# Altium schematic symbol library Regulator_Switching.SchLib: 1120 symbols (part 5 of 8) (continued)
## PAM2305AAB120 (continued)
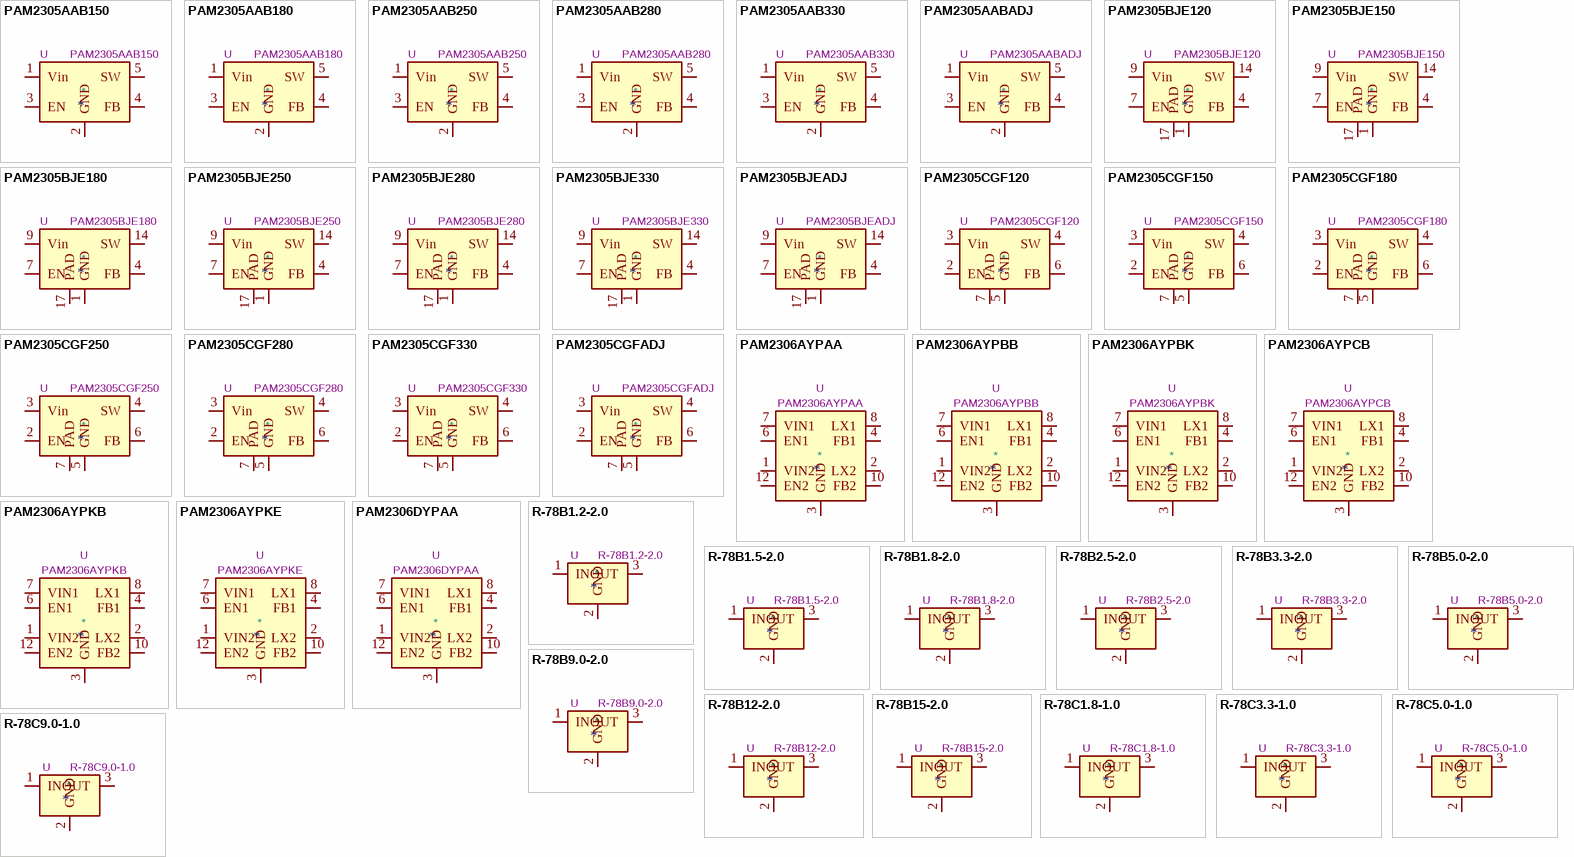
[diagram p17: symbols PAM2305AAB150 to R-78C9.0-1.0]

## PAM2305AAB150
designator *  value PAM2305AAB150  Reference: U
ki_keywords: Voltage regulator switching buck fixed output analog; ki_description: 1A, Step-Down DC/DC-Converter, 1.5V Fixed Output Voltage, 1.5MHz, TSOT-23; ki_fp_filters: TSOT?23*; Footprint: Package_TO_SOT_SMD:TSOT-23-5; Datasheet: https://www.diodes.com/assets/Datasheets/PAM2305.pdf
pins: 1 Vin, 2 GND, 3 EN, 4 FB, 5 SW

## PAM2305AAB180
designator *  value PAM2305AAB180  Reference: U
ki_keywords: Voltage regulator switching buck fixed output analog; ki_description: 1A, Step-Down DC/DC-Converter, 1.8V Fixed Output Voltage, 1.5MHz, TSOT-23; ki_fp_filters: TSOT?23*; Footprint: Package_TO_SOT_SMD:TSOT-23-5; Datasheet: https://www.diodes.com/assets/Datasheets/PAM2305.pdf
pins: 1 Vin, 2 GND, 3 EN, 4 FB, 5 SW

## PAM2305AAB250
designator *  value PAM2305AAB250  Reference: U
ki_keywords: Voltage regulator switching buck fixed output analog; ki_description: 1A, Step-Down DC/DC-Converter, 2.5V Fixed Output Voltage, 1.5MHz, TSOT-23; ki_fp_filters: TSOT?23*; Footprint: Package_TO_SOT_SMD:TSOT-23-5; Datasheet: https://www.diodes.com/assets/Datasheets/PAM2305.pdf
pins: 1 Vin, 2 GND, 3 EN, 4 FB, 5 SW

## PAM2305AAB280
designator *  value PAM2305AAB280  Reference: U
ki_keywords: Voltage regulator switching buck fixed output analog; ki_description: 1A, Step-Down DC/DC-Converter, 2.8V Fixed Output Voltage, 1.5MHz, TSOT-23; ki_fp_filters: TSOT?23*; Footprint: Package_TO_SOT_SMD:TSOT-23-5; Datasheet: https://www.diodes.com/assets/Datasheets/PAM2305.pdf
pins: 1 Vin, 2 GND, 3 EN, 4 FB, 5 SW

## PAM2305AAB330
designator *  value PAM2305AAB330  Reference: U
ki_keywords: Voltage regulator switching buck fixed output analog; ki_description: 1A, Step-Down DC/DC-Converter, 3.3V Fixed Output Voltage, 1.5MHz, TSOT-23; ki_fp_filters: TSOT?23*; Footprint: Package_TO_SOT_SMD:TSOT-23-5; Datasheet: https://www.diodes.com/assets/Datasheets/PAM2305.pdf
pins: 1 Vin, 2 GND, 3 EN, 4 FB, 5 SW

## PAM2305AABADJ
designator *  value PAM2305AABADJ  Reference: U
ki_keywords: Voltage regulator switching buck fixed output analog; ki_description: 1A, Step-Down DC/DC-Converter, Adjustable Output Voltage, 1.5MHz, TSOT-23; ki_fp_filters: TSOT?23*; Footprint: Package_TO_SOT_SMD:TSOT-23-5; Datasheet: https://www.diodes.com/assets/Datasheets/PAM2305.pdf
pins: 1 Vin, 2 GND, 3 EN, 4 FB, 5 SW

## PAM2305BJE120
designator *  value PAM2305BJE120  Reference: U
ki_keywords: Voltage regulator switching buck fixed output analog; ki_description: 1A, Step-Down DC/DC-Converter, 1.2V Fixed Output Voltage, 1.5MHz, QFN-16; ki_fp_filters: QFN*EP*3x3mm*P0.5mm*; Footprint: Package_DFN_QFN:QFN-16-1EP_3x3mm_P0.5mm_EP1.7x1.7mm; Datasheet: https://www.diodes.com/assets/Datasheets/PAM2305.pdf
pins: 1 GND, 2 GND hidden, 3 GND hidden, 4 FB, 5 GND hidden, 6 NC hidden, 7 EN, 8 NC hidden, 9 Vin, 10 Vin hidden, 11 Vin hidden, 12 Vin hidden, 13 SW hidden, 14 SW, 15 SW hidden, 16 NC hidden, 17 PAD

## PAM2305BJE150
designator *  value PAM2305BJE150  Reference: U
ki_keywords: Voltage regulator switching buck fixed output analog; ki_description: 1A, Step-Down DC/DC-Converter, 1.5V Fixed Output Voltage, 1.5MHz, QFN-16; ki_fp_filters: QFN*EP*3x3mm*P0.5mm*; Footprint: Package_DFN_QFN:QFN-16-1EP_3x3mm_P0.5mm_EP1.7x1.7mm; Datasheet: https://www.diodes.com/assets/Datasheets/PAM2305.pdf
pins: 1 GND, 2 GND hidden, 3 GND hidden, 4 FB, 5 GND hidden, 6 NC hidden, 7 EN, 8 NC hidden, 9 Vin, 10 Vin hidden, 11 Vin hidden, 12 Vin hidden, 13 SW hidden, 14 SW, 15 SW hidden, 16 NC hidden, 17 PAD

## PAM2305BJE180
designator *  value PAM2305BJE180  Reference: U
ki_keywords: Voltage regulator switching buck fixed output analog; ki_description: 1A, Step-Down DC/DC-Converter, 1.8V Fixed Output Voltage, 1.5MHz, QFN-16; ki_fp_filters: QFN*EP*3x3mm*P0.5mm*; Footprint: Package_DFN_QFN:QFN-16-1EP_3x3mm_P0.5mm_EP1.7x1.7mm; Datasheet: https://www.diodes.com/assets/Datasheets/PAM2305.pdf
pins: 1 GND, 2 GND hidden, 3 GND hidden, 4 FB, 5 GND hidden, 6 NC hidden, 7 EN, 8 NC hidden, 9 Vin, 10 Vin hidden, 11 Vin hidden, 12 Vin hidden, 13 SW hidden, 14 SW, 15 SW hidden, 16 NC hidden, 17 PAD

## PAM2305BJE250
designator *  value PAM2305BJE250  Reference: U
ki_keywords: Voltage regulator switching buck fixed output analog; ki_description: 1A, Step-Down DC/DC-Converter, 2.5V Fixed Output Voltage, 1.5MHz, QFN-16; ki_fp_filters: QFN*EP*3x3mm*P0.5mm*; Footprint: Package_DFN_QFN:QFN-16-1EP_3x3mm_P0.5mm_EP1.7x1.7mm; Datasheet: https://www.diodes.com/assets/Datasheets/PAM2305.pdf
pins: 1 GND, 2 GND hidden, 3 GND hidden, 4 FB, 5 GND hidden, 6 NC hidden, 7 EN, 8 NC hidden, 9 Vin, 10 Vin hidden, 11 Vin hidden, 12 Vin hidden, 13 SW hidden, 14 SW, 15 SW hidden, 16 NC hidden, 17 PAD

## PAM2305BJE280
designator *  value PAM2305BJE280  Reference: U
ki_keywords: Voltage regulator switching buck fixed output analog; ki_description: 1A, Step-Down DC/DC-Converter, 2.8V Fixed Output Voltage, 1.5MHz, QFN-16; ki_fp_filters: QFN*EP*3x3mm*P0.5mm*; Footprint: Package_DFN_QFN:QFN-16-1EP_3x3mm_P0.5mm_EP1.7x1.7mm; Datasheet: https://www.diodes.com/assets/Datasheets/PAM2305.pdf
pins: 1 GND, 2 GND hidden, 3 GND hidden, 4 FB, 5 GND hidden, 6 NC hidden, 7 EN, 8 NC hidden, 9 Vin, 10 Vin hidden, 11 Vin hidden, 12 Vin hidden, 13 SW hidden, 14 SW, 15 SW hidden, 16 NC hidden, 17 PAD

## PAM2305BJE330
designator *  value PAM2305BJE330  Reference: U
ki_keywords: Voltage regulator switching buck fixed output analog; ki_description: 1A, Step-Down DC/DC-Converter, 3.3V Fixed Output Voltage, 1.5MHz, QFN-16; ki_fp_filters: QFN*EP*3x3mm*P0.5mm*; Footprint: Package_DFN_QFN:QFN-16-1EP_3x3mm_P0.5mm_EP1.7x1.7mm; Datasheet: https://www.diodes.com/assets/Datasheets/PAM2305.pdf
pins: 1 GND, 2 GND hidden, 3 GND hidden, 4 FB, 5 GND hidden, 6 NC hidden, 7 EN, 8 NC hidden, 9 Vin, 10 Vin hidden, 11 Vin hidden, 12 Vin hidden, 13 SW hidden, 14 SW, 15 SW hidden, 16 NC hidden, 17 PAD

## PAM2305BJEADJ
designator *  value PAM2305BJEADJ  Reference: U
ki_keywords: Voltage regulator switching buck fixed output analog; ki_description: 1A, Step-Down DC/DC-Converter, Adjustable Output Voltage, 1.5MHz, QFN-16; ki_fp_filters: QFN*EP*3x3mm*P0.5mm*; Footprint: Package_DFN_QFN:QFN-16-1EP_3x3mm_P0.5mm_EP1.7x1.7mm; Datasheet: https://www.diodes.com/assets/Datasheets/PAM2305.pdf
pins: 1 GND, 2 GND hidden, 3 GND hidden, 4 FB, 5 GND hidden, 6 NC hidden, 7 EN, 8 NC hidden, 9 Vin, 10 Vin hidden, 11 Vin hidden, 12 Vin hidden, 13 SW hidden, 14 SW, 15 SW hidden, 16 NC hidden, 17 PAD

## PAM2305CGF120
designator *  value PAM2305CGF120  Reference: U
ki_keywords: Voltage regulator switching buck fixed output analog; ki_description: 1A, Step-Down DC/DC-Converter, 1.2V Fixed Output Voltage, 1.5MHz, DFN-6; ki_fp_filters: DFN*EP*2x2mm*P0.65mm*; Footprint: Package_DFN_QFN:DFN-6-1EP_2x2mm_P0.65mm_EP1x1.6mm; Datasheet: https://www.diodes.com/assets/Datasheets/PAM2305.pdf
pins: 1 NC hidden, 2 EN, 3 Vin, 4 SW, 5 GND, 6 FB, 7 PAD

## PAM2305CGF150
designator *  value PAM2305CGF150  Reference: U
ki_keywords: Voltage regulator switching buck fixed output analog; ki_description: 1A, Step-Down DC/DC-Converter, 1.5V Fixed Output Voltage, 1.5MHz, DFN-6; ki_fp_filters: DFN*EP*2x2mm*P0.65mm*; Footprint: Package_DFN_QFN:DFN-6-1EP_2x2mm_P0.65mm_EP1x1.6mm; Datasheet: https://www.diodes.com/assets/Datasheets/PAM2305.pdf
pins: 1 NC hidden, 2 EN, 3 Vin, 4 SW, 5 GND, 6 FB, 7 PAD

## PAM2305CGF180
designator *  value PAM2305CGF180  Reference: U
ki_keywords: Voltage regulator switching buck fixed output analog; ki_description: 1A, Step-Down DC/DC-Converter, 1.8V Fixed Output Voltage, 1.5MHz, DFN-6; ki_fp_filters: DFN*EP*2x2mm*P0.65mm*; Footprint: Package_DFN_QFN:DFN-6-1EP_2x2mm_P0.65mm_EP1x1.6mm; Datasheet: https://www.diodes.com/assets/Datasheets/PAM2305.pdf
pins: 1 NC hidden, 2 EN, 3 Vin, 4 SW, 5 GND, 6 FB, 7 PAD

## PAM2305CGF250
designator *  value PAM2305CGF250  Reference: U
ki_keywords: Voltage regulator switching buck fixed output analog; ki_description: 1A, Step-Down DC/DC-Converter, 2.5V Fixed Output Voltage, 1.5MHz, DFN-6; ki_fp_filters: DFN*EP*2x2mm*P0.65mm*; Footprint: Package_DFN_QFN:DFN-6-1EP_2x2mm_P0.65mm_EP1x1.6mm; Datasheet: https://www.diodes.com/assets/Datasheets/PAM2305.pdf
pins: 1 NC hidden, 2 EN, 3 Vin, 4 SW, 5 GND, 6 FB, 7 PAD

## PAM2305CGF280
designator *  value PAM2305CGF280  Reference: U
ki_keywords: Voltage regulator switching buck fixed output analog; ki_description: 1A, Step-Down DC/DC-Converter, 2.8V Fixed Output Voltage, 1.5MHz, DFN-6; ki_fp_filters: DFN*EP*2x2mm*P0.65mm*; Footprint: Package_DFN_QFN:DFN-6-1EP_2x2mm_P0.65mm_EP1x1.6mm; Datasheet: https://www.diodes.com/assets/Datasheets/PAM2305.pdf
pins: 1 NC hidden, 2 EN, 3 Vin, 4 SW, 5 GND, 6 FB, 7 PAD

## PAM2305CGF330
designator *  value PAM2305CGF330  Reference: U
ki_keywords: Voltage regulator switching buck fixed output analog; ki_description: 1A, Step-Down DC/DC-Converter, 3.3V Fixed Output Voltage, 1.5MHz, DFN-6; ki_fp_filters: DFN*EP*2x2mm*P0.65mm*; Footprint: Package_DFN_QFN:DFN-6-1EP_2x2mm_P0.65mm_EP1x1.6mm; Datasheet: https://www.diodes.com/assets/Datasheets/PAM2305.pdf
pins: 1 NC hidden, 2 EN, 3 Vin, 4 SW, 5 GND, 6 FB, 7 PAD

## PAM2305CGFADJ
designator *  value PAM2305CGFADJ  Reference: U
ki_keywords: Voltage regulator switching buck fixed output analog; ki_description: 1A, Step-Down DC/DC-Converter, Adjustable Output Voltage, 1.5MHz, DFN-6; ki_fp_filters: DFN*EP*2x2mm*P0.65mm*; Footprint: Package_DFN_QFN:DFN-6-1EP_2x2mm_P0.65mm_EP1x1.6mm; Datasheet: https://www.diodes.com/assets/Datasheets/PAM2305.pdf
pins: 1 NC hidden, 2 EN, 3 Vin, 4 SW, 5 GND, 6 FB, 7 PAD

## PAM2306AYPAA
designator *  value PAM2306AYPAA  Reference: U
ki_keywords: STEP-DOWN Dual channel 1A Out1 ADJ, Out2 ADJ; ki_description: 1A, Dual Step-Down DC/DC-Converter, Out1 ADJ, Out2 ADJ, 1.5MHz, W-DFN3x3; ki_fp_filters: WDFN*3x3mm?P0.45mm*; Footprint: Package_DFN_QFN:WDFN-12-1EP_3x3mm_P0.45mm_EP1.7x2.5mm; Datasheet: https://www.diodes.com/assets/Datasheets/PAM2306.pdf
pins: 1 VIN2, 2 LX2, 3 GND, 4 FB1, 5 NC1 hidden, 6 EN1, 7 VIN1, 8 LX1, 9 GND hidden, 10 FB2, 11 NC2 hidden, 12 EN2, 13 GND hidden

## PAM2306AYPBB
designator *  value PAM2306AYPBB  Reference: U
ki_keywords: STEP-DOWN Dual channel 1A Out1 1.2V, Out2 1.2V; ki_description: 1A, Dual Step-Down DC/DC-Converter, Out1 1.2V, Out2 1.2V, 1.5MHz, W-DFN3x3; ki_fp_filters: WDFN*3x3mm?P0.45mm*; Footprint: Package_DFN_QFN:WDFN-12-1EP_3x3mm_P0.45mm_EP1.7x2.5mm; Datasheet: https://www.diodes.com/assets/Datasheets/PAM2306.pdf
pins: 1 VIN2, 2 LX2, 3 GND, 4 FB1, 5 NC1 hidden, 6 EN1, 7 VIN1, 8 LX1, 9 GND hidden, 10 FB2, 11 NC2 hidden, 12 EN2, 13 GND hidden

## PAM2306AYPBK
designator *  value PAM2306AYPBK  Reference: U
ki_keywords: STEP-DOWN Dual channel 1A Out1 1.5V, Out2 3.3V; ki_description: 1A, Dual Step-Down DC/DC-Converter, Out1 1.2V, Out2 3.3V, 1.5MHz, W-DFN3x3; ki_fp_filters: WDFN*3x3mm?P0.45mm*; Footprint: Package_DFN_QFN:WDFN-12-1EP_3x3mm_P0.45mm_EP1.7x2.5mm; Datasheet: https://www.diodes.com/assets/Datasheets/PAM2306.pdf
pins: 1 VIN2, 2 LX2, 3 GND, 4 FB1, 5 NC1 hidden, 6 EN1, 7 VIN1, 8 LX1, 9 GND hidden, 10 FB2, 11 NC2 hidden, 12 EN2, 13 GND hidden

## PAM2306AYPCB
designator *  value PAM2306AYPCB  Reference: U
ki_keywords: STEP-DOWN Dual channel 1A Out1 1.5V, Out2 1.2V; ki_description: 1A, Dual Step-Down DC/DC-Converter, Out1 1.5V, Out2 1.2V, 1.5MHz, W-DFN3x3; ki_fp_filters: WDFN*3x3mm?P0.45mm*; Footprint: Package_DFN_QFN:WDFN-12-1EP_3x3mm_P0.45mm_EP1.7x2.5mm; Datasheet: https://www.diodes.com/assets/Datasheets/PAM2306.pdf
pins: 1 VIN2, 2 LX2, 3 GND, 4 FB1, 5 NC1 hidden, 6 EN1, 7 VIN1, 8 LX1, 9 GND hidden, 10 FB2, 11 NC2 hidden, 12 EN2, 13 GND hidden

## PAM2306AYPKB
designator *  value PAM2306AYPKB  Reference: U
ki_keywords: STEP-DOWN Dual channel 1A Out1 3.3V, Out2 1.2V; ki_description: 1A, Dual Step-Down DC/DC-Converter, Out1 3.3V, Out2 1.2V, 1.5MHz, W-DFN3x3; ki_fp_filters: WDFN*3x3mm?P0.45mm*; Footprint: Package_DFN_QFN:WDFN-12-1EP_3x3mm_P0.45mm_EP1.7x2.5mm; Datasheet: https://www.diodes.com/assets/Datasheets/PAM2306.pdf
pins: 1 VIN2, 2 LX2, 3 GND, 4 FB1, 5 NC1 hidden, 6 EN1, 7 VIN1, 8 LX1, 9 GND hidden, 10 FB2, 11 NC2 hidden, 12 EN2, 13 GND hidden

## PAM2306AYPKE
designator *  value PAM2306AYPKE  Reference: U
ki_keywords: STEP-DOWN Dual channel 1A Out1 3.3V, Out2 1.8V; ki_description: 1A, Dual Step-Down DC/DC-Converter, Out1 3.3V, Out2 1.8V, 1.5MHz, W-DFN3x3; ki_fp_filters: WDFN*3x3mm?P0.45mm*; Footprint: Package_DFN_QFN:WDFN-12-1EP_3x3mm_P0.45mm_EP1.7x2.5mm; Datasheet: https://www.diodes.com/assets/Datasheets/PAM2306.pdf
pins: 1 VIN2, 2 LX2, 3 GND, 4 FB1, 5 NC1 hidden, 6 EN1, 7 VIN1, 8 LX1, 9 GND hidden, 10 FB2, 11 NC2 hidden, 12 EN2, 13 GND hidden

## PAM2306DYPAA
designator *  value PAM2306DYPAA  Reference: U
ki_keywords: STEP-DOWN Dual channel 1A Out1 ADJ, Out2 ADJ; ki_description: 1A, Dual Step-Down DC/DC-Converter, Out1 ADJ, Out2 ADJ, 1.5MHz, W-DFN3x3; ki_fp_filters: WDFN*3x3mm?P0.45mm*; Footprint: Package_DFN_QFN:WDFN-12-1EP_3x3mm_P0.45mm_EP1.7x2.5mm; Datasheet: https://www.diodes.com/assets/Datasheets/PAM2306D.pdf
pins: 1 VIN2, 2 LX2, 3 GND, 4 FB1, 5 NC1 hidden, 6 EN1, 7 VIN1, 8 LX1, 9 GND hidden, 10 FB2, 11 NC2 hidden, 12 EN2, 13 GND hidden

## R-78B1.2-2.0
designator *  value R-78B1.2-2.0  Reference: U
ki_keywords: dc-dc recom Step-Down DC/DC-Regulator; ki_description: 2A Step-Down DC/DC-Regulator, 4.75-32V input, 1.2V fixed Output Voltage, LM78xx replacement, -40°C to +85°C, SIP3; ki_fp_filters: Converter*DCDC*RECOM*R*78B*2.0*; Footprint: Converter_DCDC:Converter_DCDC_RECOM_R-78B-2.0_THT; Datasheet: https://www.recom-power.com/pdf/Innoline/R-78Bxx-2.0.pdf
pins: 1 IN, 2 GND, 3 OUT

## R-78B1.5-2.0
designator *  value R-78B1.5-2.0  Reference: U
ki_keywords: dc-dc recom Step-Down DC/DC-Regulator; ki_description: 2A Step-Down DC/DC-Regulator, 4.75-32V input, 1.5V fixed Output Voltage, LM78xx replacement, -40°C to +85°C, SIP3; ki_fp_filters: Converter*DCDC*RECOM*R*78B*2.0*; Footprint: Converter_DCDC:Converter_DCDC_RECOM_R-78B-2.0_THT; Datasheet: https://www.recom-power.com/pdf/Innoline/R-78Bxx-2.0.pdf
pins: 1 IN, 2 GND, 3 OUT

## R-78B1.8-2.0
designator *  value R-78B1.8-2.0  Reference: U
ki_keywords: dc-dc recom Step-Down DC/DC-Regulator; ki_description: 2A Step-Down DC/DC-Regulator, 4.75-32V input, 1.8V fixed Output Voltage, LM78xx replacement, -40°C to +85°C, SIP3; ki_fp_filters: Converter*DCDC*RECOM*R*78B*2.0*; Footprint: Converter_DCDC:Converter_DCDC_RECOM_R-78B-2.0_THT; Datasheet: https://www.recom-power.com/pdf/Innoline/R-78Bxx-2.0.pdf
pins: 1 IN, 2 GND, 3 OUT

## R-78B2.5-2.0
designator *  value R-78B2.5-2.0  Reference: U
ki_keywords: dc-dc recom Step-Down DC/DC-Regulator; ki_description: 2A Step-Down DC/DC-Regulator, 4.75-32V input, 2.5V fixed Output Voltage, LM78xx replacement, -40°C to +85°C, SIP3; ki_fp_filters: Converter*DCDC*RECOM*R*78B*2.0*; Footprint: Converter_DCDC:Converter_DCDC_RECOM_R-78B-2.0_THT; Datasheet: https://www.recom-power.com/pdf/Innoline/R-78Bxx-2.0.pdf
pins: 1 IN, 2 GND, 3 OUT

## R-78B3.3-2.0
designator *  value R-78B3.3-2.0  Reference: U
ki_keywords: dc-dc recom Step-Down DC/DC-Regulator; ki_description: 2A Step-Down DC/DC-Regulator, 4.75-32V input, 3.3V fixed Output Voltage, LM78xx replacement, -40°C to +85°C, SIP3; ki_fp_filters: Converter*DCDC*RECOM*R*78B*2.0*; Footprint: Converter_DCDC:Converter_DCDC_RECOM_R-78B-2.0_THT; Datasheet: https://www.recom-power.com/pdf/Innoline/R-78Bxx-2.0.pdf
pins: 1 IN, 2 GND, 3 OUT

## R-78B5.0-2.0
designator *  value R-78B5.0-2.0  Reference: U
ki_keywords: dc-dc recom Step-Down DC/DC-Regulator; ki_description: 2A Step-Down DC/DC-Regulator, 6.5-32V input, 5.0V fixed Output Voltage, LM78xx replacement, -40°C to +85°C, SIP3; ki_fp_filters: Converter*DCDC*RECOM*R*78B*2.0*; Footprint: Converter_DCDC:Converter_DCDC_RECOM_R-78B-2.0_THT; Datasheet: https://www.recom-power.com/pdf/Innoline/R-78Bxx-2.0.pdf
pins: 1 IN, 2 GND, 3 OUT

## R-78B9.0-2.0
designator *  value R-78B9.0-2.0  Reference: U
ki_keywords: dc-dc recom Step-Down DC/DC-Regulator; ki_description: 2A Step-Down DC/DC-Regulator, 11-32V input, 9.0V fixed Output Voltage, LM78xx replacement, -40°C to +85°C, SIP3; ki_fp_filters: Converter*DCDC*RECOM*R*78B*2.0*; Footprint: Converter_DCDC:Converter_DCDC_RECOM_R-78B-2.0_THT; Datasheet: https://www.recom-power.com/pdf/Innoline/R-78Bxx-2.0.pdf
pins: 1 IN, 2 GND, 3 OUT

## R-78B12-2.0
designator *  value R-78B12-2.0  Reference: U
ki_keywords: dc-dc recom Step-Down DC/DC-Regulator; ki_description: 2A Step-Down DC/DC-Regulator, 15-32V input, 12V fixed Output Voltage, LM78xx replacement, -40°C to +85°C, SIP3; ki_fp_filters: Converter*DCDC*RECOM*R*78B*2.0*; Footprint: Converter_DCDC:Converter_DCDC_RECOM_R-78B-2.0_THT; Datasheet: https://www.recom-power.com/pdf/Innoline/R-78Bxx-2.0.pdf
pins: 1 IN, 2 GND, 3 OUT

## R-78B15-2.0
designator *  value R-78B15-2.0  Reference: U
ki_keywords: dc-dc recom Step-Down DC/DC-Regulator; ki_description: 2A Step-Down DC/DC-Regulator, 18-32V input, 15V fixed Output Voltage, LM78xx replacement, -40°C to +85°C, SIP3; ki_fp_filters: Converter*DCDC*RECOM*R*78B*2.0*; Footprint: Converter_DCDC:Converter_DCDC_RECOM_R-78B-2.0_THT; Datasheet: https://www.recom-power.com/pdf/Innoline/R-78Bxx-2.0.pdf
pins: 1 IN, 2 GND, 3 OUT

## R-78C1.8-1.0
designator *  value R-78C1.8-1.0  Reference: U
ki_keywords: dc-dc recom Step-Down DC/DC-Regulator; ki_description: 1A Step-Down DC/DC-Regulator, 5-42V input, 1.8V fixed Output Voltage, LM78xx replacement, -40°C to +85°C, SIP3; ki_fp_filters: Converter*DCDC*RECOM*R*78E*0.5*; Footprint: Converter_DCDC:Converter_DCDC_RECOM_R-78E-0.5_THT; Datasheet: https://www.recom-power.com/pdf/Innoline/R-78Cxx-1.0.pdf
pins: 1 IN, 2 GND, 3 OUT

## R-78C3.3-1.0
designator *  value R-78C3.3-1.0  Reference: U
ki_keywords: dc-dc recom Step-Down DC/DC-Regulator; ki_description: 1A Step-Down DC/DC-Regulator, 6-42V input, 3.3V fixed Output Voltage, LM78xx replacement, -40°C to +85°C, SIP3; ki_fp_filters: Converter*DCDC*RECOM*R*78E*0.5*; Footprint: Converter_DCDC:Converter_DCDC_RECOM_R-78E-0.5_THT; Datasheet: https://www.recom-power.com/pdf/Innoline/R-78Cxx-1.0.pdf
pins: 1 IN, 2 GND, 3 OUT

## R-78C5.0-1.0
designator *  value R-78C5.0-1.0  Reference: U
ki_keywords: dc-dc recom Step-Down DC/DC-Regulator; ki_description: 1A Step-Down DC/DC-Regulator, 7-42V input, 5V fixed Output Voltage, LM78xx replacement, -40°C to +85°C, SIP3; ki_fp_filters: Converter*DCDC*RECOM*R*78E*0.5*; Footprint: Converter_DCDC:Converter_DCDC_RECOM_R-78E-0.5_THT; Datasheet: https://www.recom-power.com/pdf/Innoline/R-78Cxx-1.0.pdf
pins: 1 IN, 2 GND, 3 OUT

## R-78C9.0-1.0
designator *  value R-78C9.0-1.0  Reference: U
ki_keywords: dc-dc recom Step-Down DC/DC-Regulator; ki_description: 1A Step-Down DC/DC-Regulator, 12-42V input, 9V fixed Output Voltage, LM78xx replacement, -40°C to +85°C, SIP3; ki_fp_filters: Converter*DCDC*RECOM*R*78E*0.5*; Footprint: Converter_DCDC:Converter_DCDC_RECOM_R-78E-0.5_THT; Datasheet: https://www.recom-power.com/pdf/Innoline/R-78Cxx-1.0.pdf
pins: 1 IN, 2 GND, 3 OUT

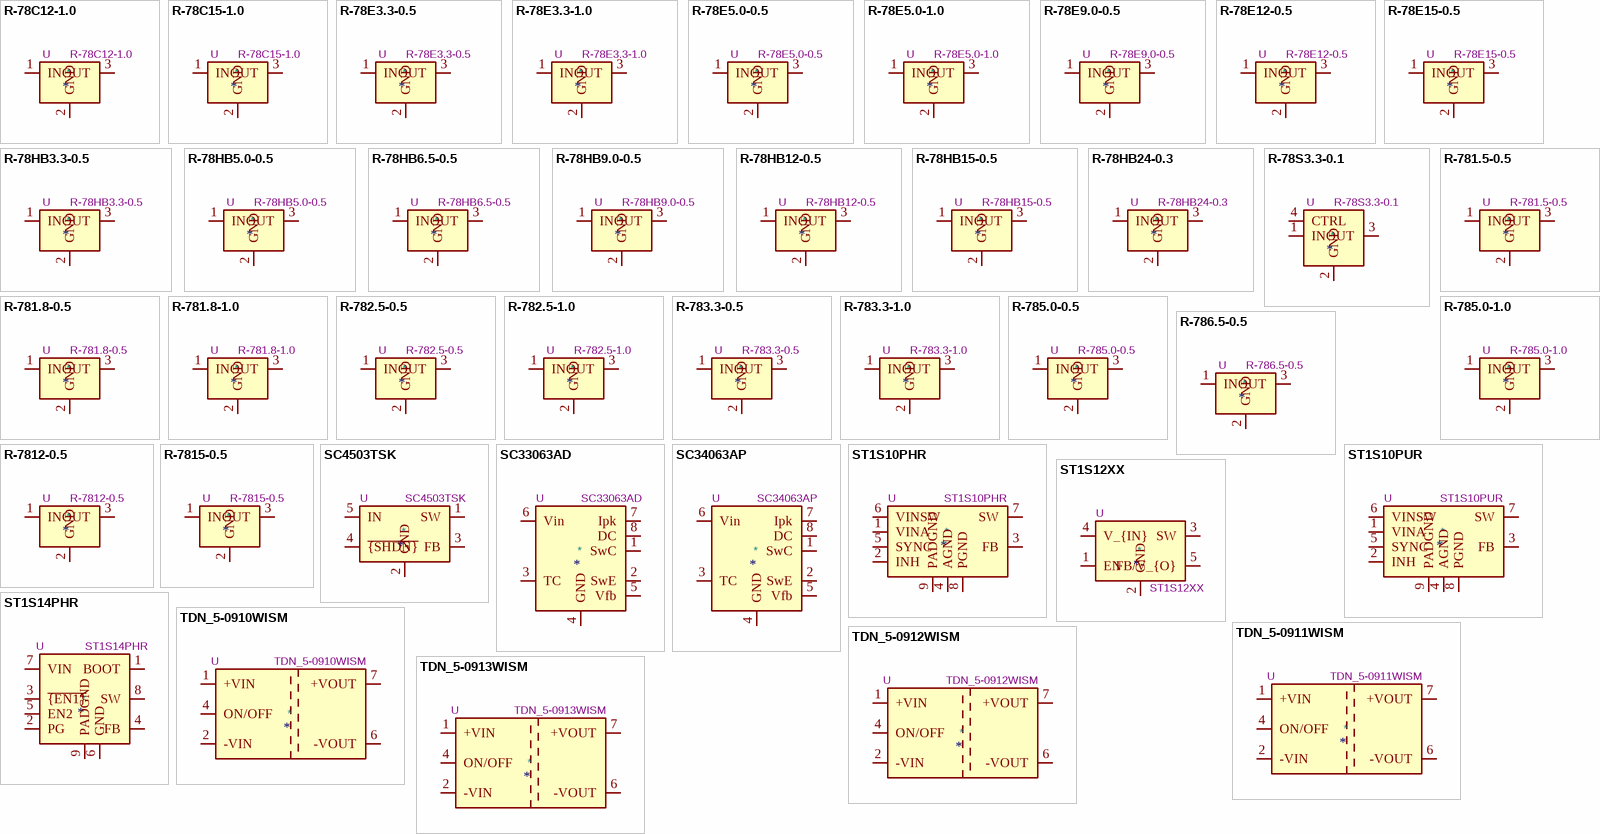
[diagram p18: symbols R-78C12-1.0 to TDN_5-0913WISM]

## R-78C12-1.0
designator *  value R-78C12-1.0  Reference: U
ki_keywords: dc-dc recom Step-Down DC/DC-Regulator; ki_description: 1A Step-Down DC/DC-Regulator, 15-42V input, 12V fixed Output Voltage, LM78xx replacement, -40°C to +85°C, SIP3; ki_fp_filters: Converter*DCDC*RECOM*R*78E*0.5*; Footprint: Converter_DCDC:Converter_DCDC_RECOM_R-78E-0.5_THT; Datasheet: https://www.recom-power.com/pdf/Innoline/R-78Cxx-1.0.pdf
pins: 1 IN, 2 GND, 3 OUT

## R-78C15-1.0
designator *  value R-78C15-1.0  Reference: U
ki_keywords: dc-dc recom Step-Down DC/DC-Regulator; ki_description: 1A Step-Down DC/DC-Regulator, 18-42V input, 15V fixed Output Voltage, LM78xx replacement, -40°C to +85°C, SIP3; ki_fp_filters: Converter*DCDC*RECOM*R*78E*0.5*; Footprint: Converter_DCDC:Converter_DCDC_RECOM_R-78E-0.5_THT; Datasheet: https://www.recom-power.com/pdf/Innoline/R-78Cxx-1.0.pdf
pins: 1 IN, 2 GND, 3 OUT

## R-78E3.3-0.5
designator *  value R-78E3.3-0.5  Reference: U
ki_keywords: dc-dc recom Step-Down DC/DC-Regulator; ki_description: 500mA Step-Down DC/DC-Regulator, 6-28V input, 3.3V fixed Output Voltage, LM78xx replacement, -40°C to +85°C, SIP3; ki_fp_filters: Converter*DCDC*RECOM*R*78E*0.5*; Footprint: Converter_DCDC:Converter_DCDC_RECOM_R-78E-0.5_THT; Datasheet: https://www.recom-power.com/pdf/Innoline/R-78Exx-0.5.pdf
pins: 1 IN, 2 GND, 3 OUT

## R-78E3.3-1.0
designator *  value R-78E3.3-1.0  Reference: U
ki_keywords: dc-dc recom Step-Down DC/DC-Regulator; ki_description: 1A Step-Down DC/DC-Regulator, 6-28V input, 3.3V fixed Output Voltage, LM78xx replacement, -40°C to +85°C, SIP3; ki_fp_filters: Converter*DCDC*RECOM*R*78E*0.5*; Footprint: Converter_DCDC:Converter_DCDC_RECOM_R-78E-0.5_THT; Datasheet: https://www.recom-power.com/pdf/Innoline/R-78Exx-1.0.pdf
pins: 1 IN, 2 GND, 3 OUT

## R-78E5.0-0.5
designator *  value R-78E5.0-0.5  Reference: U
ki_keywords: dc-dc recom Step-Down DC/DC-Regulator; ki_description: 500mA Step-Down DC/DC-Regulator, 7-28V input, 5V fixed Output Voltage, LM78xx replacement, -40°C to +85°C, SIP3; ki_fp_filters: Converter*DCDC*RECOM*R*78E*0.5*; Footprint: Converter_DCDC:Converter_DCDC_RECOM_R-78E-0.5_THT; Datasheet: https://www.recom-power.com/pdf/Innoline/R-78Exx-0.5.pdf
pins: 1 IN, 2 GND, 3 OUT

## R-78E5.0-1.0
designator *  value R-78E5.0-1.0  Reference: U
ki_keywords: dc-dc recom Step-Down DC/DC-Regulator; ki_description: 1A Step-Down DC/DC-Regulator, 7-28V input, 5V fixed Output Voltage, LM78xx replacement, -40°C to +85°C, SIP3; ki_fp_filters: Converter*DCDC*RECOM*R*78E*0.5*; Footprint: Converter_DCDC:Converter_DCDC_RECOM_R-78E-0.5_THT; Datasheet: https://www.recom-power.com/pdf/Innoline/R-78Exx-1.0.pdf
pins: 1 IN, 2 GND, 3 OUT

## R-78E9.0-0.5
designator *  value R-78E9.0-0.5  Reference: U
ki_keywords: dc-dc recom Step-Down DC/DC-Regulator; ki_description: 500mA Step-Down DC/DC-Regulator, 12-28V input, 9V fixed Output Voltage, LM78xx replacement, -40°C to +85°C, SIP3; ki_fp_filters: Converter*DCDC*RECOM*R*78E*0.5*; Footprint: Converter_DCDC:Converter_DCDC_RECOM_R-78E-0.5_THT; Datasheet: https://www.recom-power.com/pdf/Innoline/R-78Exx-0.5.pdf
pins: 1 IN, 2 GND, 3 OUT

## R-78E12-0.5
designator *  value R-78E12-0.5  Reference: U
ki_keywords: dc-dc recom Step-Down DC/DC-Regulator; ki_description: 500mA Step-Down DC/DC-Regulator, 15-28V input, 12V fixed Output Voltage, LM78xx replacement, -40°C to +85°C, SIP3; ki_fp_filters: Converter*DCDC*RECOM*R*78E*0.5*; Footprint: Converter_DCDC:Converter_DCDC_RECOM_R-78E-0.5_THT; Datasheet: https://www.recom-power.com/pdf/Innoline/R-78Exx-0.5.pdf
pins: 1 IN, 2 GND, 3 OUT

## R-78E15-0.5
designator *  value R-78E15-0.5  Reference: U
ki_keywords: dc-dc recom Step-Down DC/DC-Regulator; ki_description: 500mA Step-Down DC/DC-Regulator, 18-28V input, 15V fixed Output Voltage, LM78xx replacement, -40°C to +85°C, SIP3; ki_fp_filters: Converter*DCDC*RECOM*R*78E*0.5*; Footprint: Converter_DCDC:Converter_DCDC_RECOM_R-78E-0.5_THT; Datasheet: https://www.recom-power.com/pdf/Innoline/R-78Exx-0.5.pdf
pins: 1 IN, 2 GND, 3 OUT

## R-78HB3.3-0.5
designator *  value R-78HB3.3-0.5  Reference: U
ki_keywords: dc-dc recom Step-Down DC/DC-Regulator; ki_description: 500mA Step-Down DC/DC-Regulator, 9-72V input, 3.3V fixed Output Voltage, LM78xx replacement, -40°C to +85°C, SIP3; ki_fp_filters: Converter*DCDC*RECOM*R*78HB*0.5*; Footprint: Converter_DCDC:Converter_DCDC_RECOM_R-78HB-0.5_THT; Datasheet: https://www.recom-power.com/pdf/Innoline/R-78HBxx-0.5_L.pdf
pins: 1 IN, 2 GND, 3 OUT

## R-78HB5.0-0.5
designator *  value R-78HB5.0-0.5  Reference: U
ki_keywords: dc-dc recom Step-Down DC/DC-Regulator; ki_description: 500mA Step-Down DC/DC-Regulator, 9-72V input, 5.0V fixed Output Voltage, LM78xx replacement, -40°C to +85°C, SIP3; ki_fp_filters: Converter*DCDC*RECOM*R*78HB*0.5*; Footprint: Converter_DCDC:Converter_DCDC_RECOM_R-78HB-0.5_THT; Datasheet: https://www.recom-power.com/pdf/Innoline/R-78HBxx-0.5_L.pdf
pins: 1 IN, 2 GND, 3 OUT

## R-78HB6.5-0.5
designator *  value R-78HB6.5-0.5  Reference: U
ki_keywords: dc-dc recom Step-Down DC/DC-Regulator; ki_description: 500mA Step-Down DC/DC-Regulator, 9-72V input, 6.5V fixed Output Voltage, LM78xx replacement, -40°C to +85°C, SIP3; ki_fp_filters: Converter*DCDC*RECOM*R*78HB*0.5*; Footprint: Converter_DCDC:Converter_DCDC_RECOM_R-78HB-0.5_THT; Datasheet: https://www.recom-power.com/pdf/Innoline/R-78HBxx-0.5_L.pdf
pins: 1 IN, 2 GND, 3 OUT

## R-78HB9.0-0.5
designator *  value R-78HB9.0-0.5  Reference: U
ki_keywords: dc-dc recom Step-Down DC/DC-Regulator; ki_description: 500mA Step-Down DC/DC-Regulator, 14-72V input, 9.0V fixed Output Voltage, LM78xx replacement, -40°C to +85°C, SIP3; ki_fp_filters: Converter*DCDC*RECOM*R*78HB*0.5*; Footprint: Converter_DCDC:Converter_DCDC_RECOM_R-78HB-0.5_THT; Datasheet: https://www.recom-power.com/pdf/Innoline/R-78HBxx-0.5_L.pdf
pins: 1 IN, 2 GND, 3 OUT

## R-78HB12-0.5
designator *  value R-78HB12-0.5  Reference: U
ki_keywords: dc-dc recom Step-Down DC/DC-Regulator; ki_description: 500mA Step-Down DC/DC-Regulator, 17-72V input, 12V fixed Output Voltage, LM78xx replacement, -40°C to +85°C, SIP3; ki_fp_filters: Converter*DCDC*RECOM*R*78HB*0.5*; Footprint: Converter_DCDC:Converter_DCDC_RECOM_R-78HB-0.5_THT; Datasheet: https://www.recom-power.com/pdf/Innoline/R-78HBxx-0.5_L.pdf
pins: 1 IN, 2 GND, 3 OUT

## R-78HB15-0.5
designator *  value R-78HB15-0.5  Reference: U
ki_keywords: dc-dc recom Step-Down DC/DC-Regulator; ki_description: 500mA Step-Down DC/DC-Regulator, 20-72V input, 15V fixed Output Voltage, LM78xx replacement, -40°C to +85°C, SIP3; ki_fp_filters: Converter*DCDC*RECOM*R*78HB*0.5*; Footprint: Converter_DCDC:Converter_DCDC_RECOM_R-78HB-0.5_THT; Datasheet: https://www.recom-power.com/pdf/Innoline/R-78HBxx-0.5_L.pdf
pins: 1 IN, 2 GND, 3 OUT

## R-78HB24-0.3
designator *  value R-78HB24-0.3  Reference: U
ki_keywords: dc-dc recom Step-Down DC/DC-Regulator; ki_description: 300mA Step-Down DC/DC-Regulator, 36-72V input, 24V fixed Output Voltage, LM78xx replacement, -40°C to +85°C, SIP3; ki_fp_filters: Converter*DCDC*RECOM*R*78HB*0.5*; Footprint: Converter_DCDC:Converter_DCDC_RECOM_R-78HB-0.5_THT; Datasheet: https://www.recom-power.com/pdf/Innoline/R-78HBxx-0.5_L.pdf
pins: 1 IN, 2 GND, 3 OUT

## R-78S3.3-0.1
designator *  value R-78S3.3-0.1  Reference: U
ki_keywords: dc-dc recom Step-Down DC/DC-Regulator; ki_description: 100mA Step-Up DC/DC-Regulator, 0.65-3.15V input, 3.3V fixed Output Voltage, LM78xx replacement, -40°C to +85°C, SIP4; ki_fp_filters: Converter*DCDC*RECOM*R*78S*0.1*; Footprint: Converter_DCDC:Converter_DCDC_RECOM_R-78S-0.1_THT; Datasheet: https://www.recom-power.com/pdf/Innoline/R-78Sxx-0.1.pdf
pins: 1 IN, 2 GND, 3 OUT, 4 CTRL

## R-781.5-0.5
designator *  value R-781.5-0.5  Reference: U
ki_keywords: dc-dc recom Step-Down DC/DC-Regulator; ki_description: 500mA Step-Down DC/DC-Regulator, 4.75-30V input, 1.5V fixed Output Voltage, LM78xx replacement, -40°C to +85°C, SIP3; ki_fp_filters: Converter*DCDC*RECOM*R*78E*0.5*; Footprint: Converter_DCDC:Converter_DCDC_RECOM_R-78E-0.5_THT; Datasheet: https://www.recom-power.com/pdf/Innoline/R-78xx-0.5.pdf
pins: 1 IN, 2 GND, 3 OUT

## R-781.8-0.5
designator *  value R-781.8-0.5  Reference: U
ki_keywords: dc-dc recom Step-Down DC/DC-Regulator; ki_description: 500mA Step-Down DC/DC-Regulator, 4.75-32V input, 1.8V fixed Output Voltage, LM78xx replacement, -40°C to +85°C, SIP3; ki_fp_filters: Converter*DCDC*RECOM*R*78E*0.5*; Footprint: Converter_DCDC:Converter_DCDC_RECOM_R-78E-0.5_THT; Datasheet: https://www.recom-power.com/pdf/Innoline/R-78xx-0.5.pdf
pins: 1 IN, 2 GND, 3 OUT

## R-781.8-1.0
designator *  value R-781.8-1.0  Reference: U
ki_keywords: dc-dc recom Step-Down DC/DC-Regulator; ki_description: 1A Step-Down DC/DC-Regulator, 4.75-18V input, 1.8V fixed Output Voltage, LM78xx replacement, -40°C to +85°C, SIP3; ki_fp_filters: Converter*DCDC*RECOM*R*78E*0.5*; Footprint: Converter_DCDC:Converter_DCDC_RECOM_R-78E-0.5_THT; Datasheet: https://www.recom-power.com/pdf/Innoline/R-78xx-1.0.pdf
pins: 1 IN, 2 GND, 3 OUT

## R-782.5-0.5
designator *  value R-782.5-0.5  Reference: U
ki_keywords: dc-dc recom Step-Down DC/DC-Regulator; ki_description: 500mA Step-Down DC/DC-Regulator, 4.75-18V input, 2.5V fixed Output Voltage, LM78xx replacement, -40°C to +85°C, SIP3; ki_fp_filters: Converter*DCDC*RECOM*R*78E*0.5*; Footprint: Converter_DCDC:Converter_DCDC_RECOM_R-78E-0.5_THT; Datasheet: https://www.recom-power.com/pdf/Innoline/R-78xx-0.5.pdf
pins: 1 IN, 2 GND, 3 OUT

## R-782.5-1.0
designator *  value R-782.5-1.0  Reference: U
ki_keywords: dc-dc recom Step-Down DC/DC-Regulator; ki_description: 1A Step-Down DC/DC-Regulator, 4.75-18V input, 2.5V fixed Output Voltage, LM78xx replacement, -40°C to +85°C, SIP3; ki_fp_filters: Converter*DCDC*RECOM*R*78E*0.5*; Footprint: Converter_DCDC:Converter_DCDC_RECOM_R-78E-0.5_THT; Datasheet: https://www.recom-power.com/pdf/Innoline/R-78xx-1.0.pdf
pins: 1 IN, 2 GND, 3 OUT

## R-783.3-0.5
designator *  value R-783.3-0.5  Reference: U
ki_keywords: dc-dc recom Step-Down DC/DC-Regulator; ki_description: 500mA Step-Down DC/DC-Regulator, 4.75-18V input, 3.3V fixed Output Voltage, LM78xx replacement, -40°C to +85°C, SIP3; ki_fp_filters: Converter*DCDC*RECOM*R*78E*0.5*; Footprint: Converter_DCDC:Converter_DCDC_RECOM_R-78E-0.5_THT; Datasheet: https://www.recom-power.com/pdf/Innoline/R-78xx-0.5.pdf
pins: 1 IN, 2 GND, 3 OUT

## R-783.3-1.0
designator *  value R-783.3-1.0  Reference: U
ki_keywords: dc-dc recom Step-Down DC/DC-Regulator; ki_description: 1A Step-Down DC/DC-Regulator, 4.75-18V input, 3.3V fixed Output Voltage, LM78xx replacement, -40°C to +85°C, SIP3; ki_fp_filters: Converter*DCDC*RECOM*R*78E*0.5*; Footprint: Converter_DCDC:Converter_DCDC_RECOM_R-78E-0.5_THT; Datasheet: https://www.recom-power.com/pdf/Innoline/R-78xx-1.0.pdf
pins: 1 IN, 2 GND, 3 OUT

## R-785.0-0.5
designator *  value R-785.0-0.5  Reference: U
ki_keywords: dc-dc recom Step-Down DC/DC-Regulator; ki_description: 500mA Step-Down DC/DC-Regulator, 6.5-18V input, 5V fixed Output Voltage, LM78xx replacement, -40°C to +85°C, SIP3; ki_fp_filters: Converter*DCDC*RECOM*R*78E*0.5*; Footprint: Converter_DCDC:Converter_DCDC_RECOM_R-78E-0.5_THT; Datasheet: https://www.recom-power.com/pdf/Innoline/R-78xx-0.5.pdf
pins: 1 IN, 2 GND, 3 OUT

## R-785.0-1.0
designator *  value R-785.0-1.0  Reference: U
ki_keywords: dc-dc recom Step-Down DC/DC-Regulator; ki_description: 1A Step-Down DC/DC-Regulator, 6.5-18V input, 5V fixed Output Voltage, LM78xx replacement, -40°C to +85°C, SIP3; ki_fp_filters: Converter*DCDC*RECOM*R*78E*0.5*; Footprint: Converter_DCDC:Converter_DCDC_RECOM_R-78E-0.5_THT; Datasheet: https://www.recom-power.com/pdf/Innoline/R-78xx-1.0.pdf
pins: 1 IN, 2 GND, 3 OUT

## R-786.5-0.5
designator *  value R-786.5-0.5  Reference: U
ki_keywords: dc-dc recom Step-Down DC/DC-Regulator; ki_description: 500mA Step-Down DC/DC-Regulator, 8-32V input, 6.5V fixed Output Voltage, LM78xx replacement, -40°C to +85°C, SIP3; ki_fp_filters: Converter*DCDC*RECOM*R*78E*0.5*; Footprint: Converter_DCDC:Converter_DCDC_RECOM_R-78E-0.5_THT; Datasheet: https://www.recom-power.com/pdf/Innoline/R-78xx-0.5.pdf
pins: 1 IN, 2 GND, 3 OUT

## R-7812-0.5
designator *  value R-7812-0.5  Reference: U
ki_keywords: dc-dc recom Step-Down DC/DC-Regulator; ki_description: 500mA Step-Down DC/DC-Regulator, 15-32V input, 12V fixed Output Voltage, LM78xx replacement, -40°C to +85°C, SIP3; ki_fp_filters: Converter*DCDC*RECOM*R*78E*0.5*; Footprint: Converter_DCDC:Converter_DCDC_RECOM_R-78E-0.5_THT; Datasheet: https://www.recom-power.com/pdf/Innoline/R-78xx-0.5.pdf
pins: 1 IN, 2 GND, 3 OUT

## R-7815-0.5
designator *  value R-7815-0.5  Reference: U
ki_keywords: dc-dc recom Step-Down DC/DC-Regulator; ki_description: 500mA Step-Down DC/DC-Regulator, 18-32V input, 15V fixed Output Voltage, LM78xx replacement, -40°C to +85°C, SIP3; ki_fp_filters: Converter*DCDC*RECOM*R*78E*0.5*; Footprint: Converter_DCDC:Converter_DCDC_RECOM_R-78E-0.5_THT; Datasheet: https://www.recom-power.com/pdf/Innoline/R-78xx-0.5.pdf
pins: 1 IN, 2 GND, 3 OUT

## SC4503TSK
designator *  value SC4503TSK  Reference: U
ki_keywords: 1.9A 1.3MHz Step-Up DC/DC; ki_description: 1.9A, 1.3MHz Step-Up DC/DC Converter, 2.5V-20V output voltage, TSOT23; ki_fp_filters: TSOT*23*; Footprint: Package_TO_SOT_SMD:TSOT-23-5; Datasheet: https://www.semtech.com/uploads/documents/sc4503.pdf
pins: 1 SW, 2 GND, 3 FB, 4 ~{{SHDN}}, 5 IN

## SC33063AD
designator *  value SC33063AD  Reference: U
ki_keywords: smps buck boost inverting; ki_description: 1.5A, step-up/down/inverting switching regulator, 3-40V Vin, 100kHz, SO-8; ki_fp_filters: SOIC*3.9x4.9mm*P1.27mm*; Footprint: Package_SO:SOIC-8_3.9x4.9mm_P1.27mm; Datasheet: http://www.onsemi.com/pub_link/Collateral/MC34063A-D.PDF
pins: 1 SwC, 2 SwE, 3 TC, 4 GND, 5 Vfb, 6 Vin, 7 Ipk, 8 DC

## SC34063AP
designator *  value SC34063AP  Reference: U
ki_keywords: smps buck boost inverting; ki_description: 1.5A, step-up/down/inverting switching regulator, 3-40V Vin, 100kHz, DIP-8; ki_fp_filters: DIP*W7.62mm*; Footprint: Package_DIP:DIP-8_W7.62mm; Datasheet: http://www.onsemi.com/pub_link/Collateral/MC34063A-D.PDF
pins: 1 SwC, 2 SwE, 3 TC, 4 GND, 5 Vfb, 6 Vin, 7 Ipk, 8 DC

## ST1S10PHR
designator *  value ST1S10PHR  Reference: U
ki_keywords: DC/DC Buck Conwerter 3A Low Voltage Input; ki_description: 3A monolithic synchronous step-down regulator, Adjustable Output Voltage, 2.5-18V Input Voltage, 900kHz, PowerSO-8; ki_fp_filters: TI*SO*PowerPAD*; Footprint: Package_SO:TI_SO-PowerPAD-8; Datasheet: http://www.st.com/internet/com/TECHNICAL_RESOURCES/TECHNICAL_LITERATURE/DATASHEET/CD00169322.pdf
pins: 1 VINA, 2 INH, 3 FB, 4 AGND, 5 SYNC, 6 VINSW, 7 SW, 8 PGND, 9 PADGND

## ST1S10PUR
designator *  value ST1S10PUR  Reference: U
ki_keywords: DC/DC Buck Conwerter 3A Low Voltage Input; ki_description: 3A monolithic synchronous step-down regulator, Adjustable Output Voltage, 2.5-18V Input Voltage, 900kHz, DFN-8; ki_fp_filters: DFN*EP*4x4mm*P0.8mm*; Footprint: Package_DFN_QFN:DFN-8-1EP_4x4mm_P0.8mm_EP2.5x3.6mm; Datasheet: http://www.st.com/internet/com/TECHNICAL_RESOURCES/TECHNICAL_LITERATURE/DATASHEET/CD00169322.pdf
pins: 1 VINA, 2 INH, 3 FB, 4 AGND, 5 SYNC, 6 VINSW, 7 SW, 8 PGND, 9 PADGND

## ST1S12XX
designator *  value ST1S12XX  Reference: U
ki_keywords: DC/DC Buck Converter 0.7A; ki_description: 0.7A synchronous step-down regulator, Adjustable Output Voltage, 2.5-5.5V Input Voltage, 1.7MHz, TSOT-23-5; ki_fp_filters: TSOT?23*; Footprint: Package_TO_SOT_SMD:TSOT-23-5; Datasheet: https://www.st.com/resource/en/datasheet/st1s12xx.pdf
pins: 1 EN, 2 GND, 3 SW, 4 V_{IN}, 5 FB/V_{O}

## ST1S14PHR
designator *  value ST1S14PHR  Reference: U
ki_keywords: DC/DC Buck Conwerter 3A; ki_description: 3A step-down switching regulator, Adjustable Output Voltage, 5.5-48V Input Voltage, 850kHz, PowerSO-8; ki_fp_filters: TI*SO*PowerPAD*; Footprint: Package_SO:TI_SO-PowerPAD-8; Datasheet: http://www.st.com/internet/com/TECHNICAL_RESOURCES/TECHNICAL_LITERATURE/DATASHEET/CD00285678.pdf
pins: 1 BOOT, 2 PG, 3 ~{{EN1}}, 4 FB, 5 EN2, 6 GND, 7 VIN, 8 SW, 9 PADGND

## TDN_5-0910WISM
designator *  value TDN_5-0910WISM  Reference: U
ki_keywords: dcdc traco 5W; ki_description: Input 4.5 to 13.2V, Output 3.3V; ki_fp_filters: Converter?DCDC?TRACO?TDN?5*WISM?SMD*; Footprint: Converter_DCDC:Converter_DCDC_TRACO_TDN_5-xxxxWISM_SMD; Datasheet: https://assets.tracopower.com/20190626081517/TDN5WISM/documents/tdn5wism-datasheet.pdf
pins: 1 +VIN, 2 -VIN, 4 ON/OFF, 5 NC hidden, 6 -VOUT, 7 +VOUT

## TDN_5-0911WISM
designator *  value TDN_5-0911WISM  Reference: U
ki_keywords: dcdc traco 5W; ki_description: Input 4.5 to 13.2V, Output 5.0V; ki_fp_filters: Converter?DCDC?TRACO?TDN?5*WISM?SMD*; Footprint: Converter_DCDC:Converter_DCDC_TRACO_TDN_5-xxxxWISM_SMD; Datasheet: https://assets.tracopower.com/20190626081517/TDN5WISM/documents/tdn5wism-datasheet.pdf
pins: 1 +VIN, 2 -VIN, 4 ON/OFF, 5 NC hidden, 6 -VOUT, 7 +VOUT

## TDN_5-0912WISM
designator *  value TDN_5-0912WISM  Reference: U
ki_keywords: dcdc traco 5W; ki_description: Input 4.5 to 13.2V, Output 12.0V; ki_fp_filters: Converter?DCDC?TRACO?TDN?5*WISM?SMD*; Footprint: Converter_DCDC:Converter_DCDC_TRACO_TDN_5-xxxxWISM_SMD; Datasheet: https://assets.tracopower.com/20190626081517/TDN5WISM/documents/tdn5wism-datasheet.pdf
pins: 1 +VIN, 2 -VIN, 4 ON/OFF, 5 NC hidden, 6 -VOUT, 7 +VOUT